# Altium footprint library led.PcbLib: 30 footprints (part 2 of 2)
Each footprint in its own frame and in the unit in brackets; x right, y up, seen from the top. Pads: shape width x height; smd on the part's side, far side on the other; paste and mask are expansions set on the pad; w line width, h text height; cw(c..) or ccw(c..) is an arc to the next point about the centre after c.
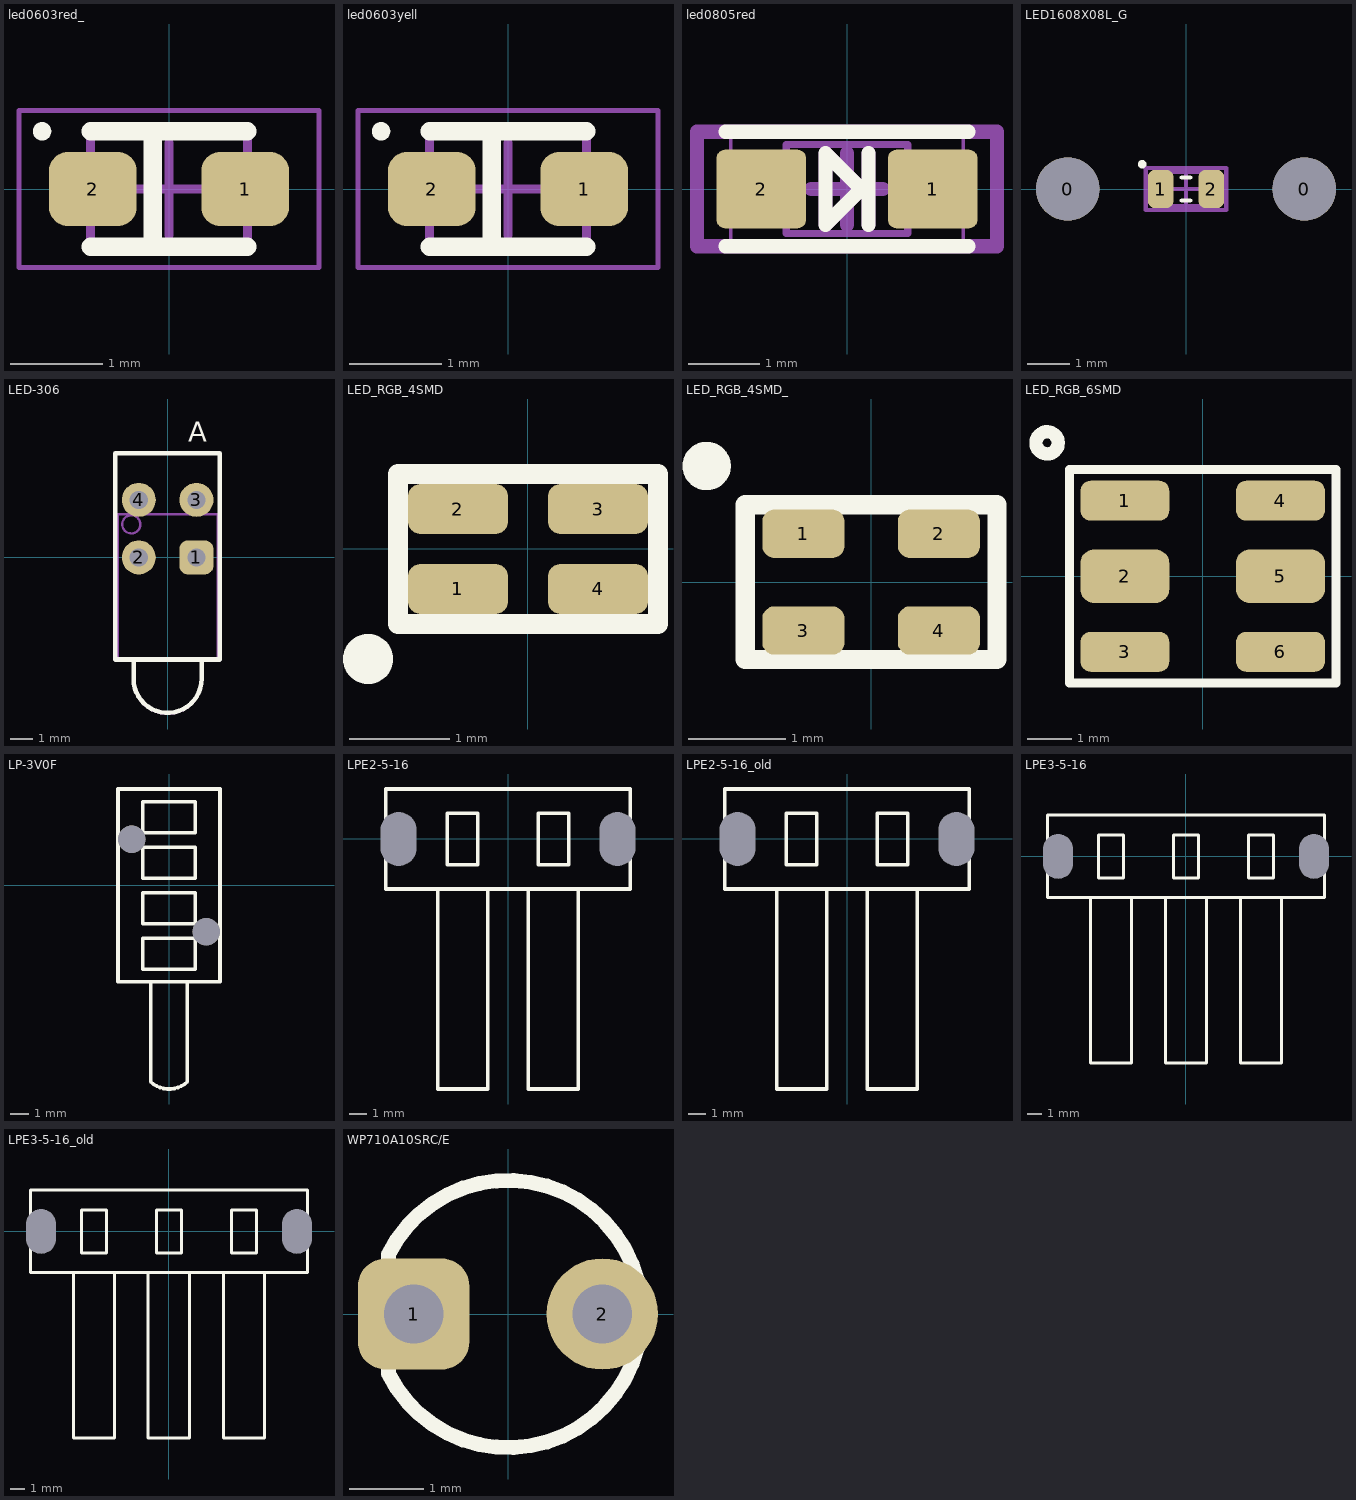
[diagram p1: the footprints below, top view; thin cyan lines are the x and y axes]

## led0603red_ [mm] "SOD323, IPC Low Density"
height 1.1
pads (2):
  rrect50% 0.95x0.8 smd: 1(0.825,0) 2(-0.825,0)
Top Overlay:
  circle w0.1: c-1.375,0.625 r0.05
  lines w0.2: -0.85,-0.625 0.85,-0.625 ; -0.85,0.625 0.85,0.625 ; -0.175,-0.625 -0.175,0.625
Mechanical 13:
  lines w0.1: -0.85,-0.625 -0.85,0.625 0.85,0.625 0.85,-0.625 -0.85,-0.625
Mechanical 15:
  lines w0.05: -1.625,-0.85 -1.625,0.85 1.625,0.85 1.625,-0.85 -1.625,-0.85
  lines w0.1: -0.5,0 0.5,0 ; 0,-0.5 0,0.5
3D body "led0603_RED.step": height 1.15, standoff 0.05, extent -0.81,-0.4 0.81,0.4

## led0603yell [mm] "SOD323, IPC Low Density"
height 1.1
pads (2):
  rrect50% 0.95x0.8 smd: 1(0.825,0) 2(-0.825,0)
Top Overlay:
  circle w0.1: c-1.375,0.625 r0.05
  lines w0.2: -0.85,-0.625 0.85,-0.625 ; -0.85,0.625 0.85,0.625 ; -0.175,-0.625 -0.175,0.625
Mechanical 13:
  lines w0.1: -0.85,-0.625 0.85,-0.625 0.85,0.625 -0.85,0.625 -0.85,-0.625
Mechanical 15:
  lines w0.05: -1.625,-0.85 1.625,-0.85 1.625,0.85 -1.625,0.85 -1.625,-0.85
  lines w0.1: -0.5,0 0.5,0 ; 0,-0.5 0,0.5
3D body "led_0603 yellow.step": height 0.65, standoff 0.05, extent -0.81,-0.4 0.81,0.4

## led0805red [mm] "IPC Low Density"
height 1.1
pads (2):
  rrect20% 1.25x1.1 smd: 1(1.2,0) 2(-1.2,0)
Top Overlay:
  lines w0.2: -1.7,-0.8 1.7,-0.8 ; -1.7,0.8 1.7,0.8 ; 0.3,-0.5 0.3,0.5 ; -0.3,-0.5 0.2,0 -0.3,0.5 -0.3,-0.5
M3_comm_top:
  text ".comment" at -0.9,-0.3 h1
M5_asm_top:
  lines w0.2: -1.7,-0.8 1.7,-0.8 ; -1.7,0.8 1.7,0.8 ; 0.3,-0.5 0.3,0.5 ; -0.3,-0.5 -0.3,0.5 0.2,0 -0.3,-0.5
  text ".Designator" at -1,1.3 h1
M7_courtyard_top:
  lines w0.2: -0.5,0 0.5,0 ; 0,-0.5 0,0.5 ; -2.1,-0.8 2.1,-0.8 2.1,0.8 -2.1,0.8 -2.1,-0.8
Mechanical 13:
  lines w0.1: -0.85,-0.625 0.85,-0.625 0.85,0.625 -0.85,0.625 -0.85,-0.625
Mechanical 15:
  lines w0.05: -1.625,-0.85 1.625,-0.85 1.625,0.85 -1.625,0.85 -1.625,-0.85
  lines w0.1: -0.5,0 0.5,0 ; 0,-0.5 0,0.5
3D body "User Library-led_0805.step": height 1.1, standoff 0, extent -1.01,-0.625 1.01,0.625

## LED1608X08L_G [mm] "Chip Diode, 2-Leads, Body 1,60x0,8mm, IPC High Density"
height 0.8
pads (4):
  round 1.5 hole 1.5: 0(-2.8,0) 0(2.8,0)
  rrect50% 0.6x0.9 smd: 1(-0.6,0) 2(0.6,0)
Top Overlay:
  circle w0.1: c-1.037,0.587 r0.05
  lines w0.1: -0.1,-0.275 0.1,-0.275 ; -0.1,0.275 0.1,0.275
M7_courtyard_top:
  lines w0.1: -0.4,0 0.4,0 ; 0,-0.4 0,0.4 ; -0.95,-0.5 0.95,-0.5 0.95,0.5 -0.95,0.5 -0.95,-0.5
M11_dimension:
  lines w0.1: -0.7,-0.4 0.7,-0.4 0.7,0.4 -0.7,0.4 -0.7,-0.4
3D body "light guide ra 0805.step": height 6.77, standoff -3.15, extent 3.845,-2.5 14.355,15.75
3D body "User Library-LED_0603_G.STEP": height 0.6, standoff 0, extent -0.8,-0.4 0.8,0.4
3D body "Svetovod.step": height 5, standoff -2.5, extent -3.8,-2.5 3.8,18

## LED-306 [mm] "LED-306(A) (CYX LED-2F)"
height 0.025
pads (4):
  rrect50% 1.5x1.5 hole 0.8: 1(1.27,0)
  round 1.5 hole 0.8: 2(-1.27,0) 3(1.27,2.54) 4(-1.27,2.54)
Top Overlay:
  lines w0.2: -1.5,-4.5 -1.5,-5.35 ccw(c0,-5.35) 1.5,-5.35 1.5,-4.5
  lines w0.203: -2.3,-4.5 2.3,-4.5 2.3,4.6 -2.3,4.6 -2.3,-4.5
  text "A" at 0.9,4.8 h1.52
Mechanical 13:
  circle w0.1: c-1.6,1.46 r0.4
  lines w0.1: -2.2,-4.5 -1.5,-4.5 -1.5,-5.4 ccw(c0,-5.4) 1.5,-5.4 1.5,-4.5 2.2,-4.5 2.2,1.9 -2.2,1.9 -2.2,-4.5
3D body "User Library-Lumex SSF-LXH240GGD.step": height 9.82, standoff -3.01, extent -2.16,-7.095 2.16,3.675

## LED_RGB_4SMD [mm] "WP154A4SUREQBFZGC"
height 5
pads (4):
  rrect50% 1x0.5 smd mask+0.1: 1(-0.7,-0.4) 2(-0.7,0.4) 3(0.7,0.4) 4(0.7,-0.4)
Top Overlay:
  circle w0.3: c-1.6,-1.1 r0.1
  lines w0.2: -1.3,-0.75 -1.3,0.75 1.3,0.75 1.3,-0.75 -1.3,-0.75
3D body: height 0.4, standoff 0.3, extent -0.3,0.1 -0.1,0.3
3D body: height 0.4, standoff 0.3, extent 0.1,0.1 0.3,0.3
3D body: height 0.4, standoff 0.3, extent -0.1,-0.3 0.1,-0.1
3D body "HSMF-C114.step": height 0.34, standoff -0.01, extent -0.8,-0.75 0.8,0.75

## LED_RGB_4SMD_ [mm] "SLM-LX0606IGC-TD"
height 5
pads (4):
  rrect50% 0.85x0.5 smd mask+0.1: 1(-0.7,0.5) 2(0.7,0.5) 3(-0.7,-0.5) 4(0.7,-0.5)
Top Overlay:
  circle w0.3: c-1.7,1.2 r0.1
  lines w0.2: -1.3,-0.8 1.3,-0.8 1.3,0.8 -1.3,0.8 -1.3,-0.8
3D body "HSMF-C114.step": height 0.34, standoff -0.01, extent -0.8,-0.75 0.8,0.75
3D body: height 0.4, standoff 0.3, extent -0.1,-0.3 0.1,-0.1
3D body: height 0.4, standoff 0.3, extent 0.1,0.1 0.3,0.3
3D body: height 0.4, standoff 0.3, extent -0.3,0.1 -0.1,0.3

## LED_RGB_6SMD [mm] "WP154A4SUREQBFZGC"
height 5
pads (6):
  rrect50% 2x0.9 smd mask+0.1: 1(-1.75,1.7) 3(-1.75,-1.7) 4(1.75,1.7) 6(1.75,-1.7)
  rrect50% 2x1.2 smd mask+0.1: 2(-1.75,0) 5(1.75,0)
Top Overlay:
  circle w0.3: c-3.5,3 r0.25
  lines w0.2: -3,-2.4 3,-2.4 3,2.4 -3,2.4 -3,-2.4
3D body: height 0.8, standoff 0.05, extent -1.25,-1.75 1.25,1.75
3D body: height 1.25, standoff 0.25, extent -0.991,-1.248 0,-0.252
3D body: height 1.25, standoff 0.25, extent -0.991,0.252 0,1.249
3D body: height 1.25, standoff 0.25, extent 0.009,-0.498 1,0.498
3D body: height 0.3, standoff 0.05, extent -1.75,-1.75 1.75,1.75

## LP-3V0F [mm]
height 0.025
pads (2):
  round 1.5 hole 1.5 unplated: ""(-2.05,2.54) ""(2.05,-2.54)
Top Overlay:
  lines w0.2: -1.009,-10.8 ccw(c0,-9.69) 1.009,-10.8 ; -1,-10.8 -1,-5.3 ; 1,-10.8 1,-5.3 ; -1.45,-4.6 -1.45,-2.9 1.45,-2.9 1.45,-4.6 -1.45,-4.6 ; -1.45,-2.1 -1.45,-0.4 1.45,-0.4 1.45,-2.1 -1.45,-2.1 ; -1.45,0.4 -1.45,2.1 1.45,2.1 1.45,0.4 -1.45,0.4 ; -1.45,2.9 1.45,2.9 1.45,4.6 -1.45,4.6 -1.45,2.9
  lines w0.203: -2.8,-5.3 -2.8,5.3 2.8,5.3 2.8,-5.3 -2.8,-5.3
3D body "LP-3V0F (1).stp": height 13.02, standoff -1.6, extent -2.8,-11.201 2.8,5.301

## LPE2-5-16 [mm] "LPE3-5-16 dart"
height 0.025
pads (2):
  round 1.5 hole 2 slot 3 at 90 deg unplated: ""(-6.125,0) ""(6.125,0)
Top Overlay:
  lines w0.2: -3.94,-2.8 -3.94,-14 -1.14,-14 -1.14,-2.8 ; 1.14,-2.8 1.14,-14 3.94,-14 3.94,-2.8 ; -6.85,-2.8 6.85,-2.8 6.85,2.8 -6.85,2.8 -6.85,-2.8 ; -3.4,-1.45 -3.4,1.45 -1.7,1.45 -1.7,-1.45 -3.4,-1.45 ; 1.7,-1.45 3.4,-1.45 3.4,1.45 1.7,1.45 1.7,-1.45
3D body "Световод 2 диода.STEP": height 6.43, standoff -2.85, extent -7.35,-14 7.35,2.9

## LPE2-5-16_old [mm] "LPE3-5-16 dart"
height 0.025
pads (2):
  round 1.5 hole 2 slot 3 at 90 deg unplated: ""(-6.125,0) ""(6.125,0)
Top Overlay:
  lines w0.2: -3.94,-2.8 -3.94,-14 -1.14,-14 -1.14,-2.8 ; 1.14,-2.8 1.14,-14 3.94,-14 3.94,-2.8 ; -6.85,-2.8 -6.85,2.8 6.85,2.8 6.85,-2.8 -6.85,-2.8 ; -3.4,-1.45 -1.7,-1.45 -1.7,1.45 -3.4,1.45 -3.4,-1.45 ; 1.7,-1.45 1.7,1.45 3.4,1.45 3.4,-1.45 1.7,-1.45
3D body "light guide ra 0805.step": height 6.77, standoff -3.15, extent -7.805,-15.35 2.705,2.9
3D body "light guide ra 0805.step": height 6.77, standoff -3.15, extent -2.68,-15.35 7.83,2.9

## LPE3-5-16 [mm] "LPE3-5-16 dart"
height 0.025
pads (2):
  round 1.5 hole 2 slot 3 at 90 deg unplated: ""(-8.675,0) ""(8.675,0)
Top Overlay:
  lines w0.2: -6.49,-2.8 -6.49,-14 -3.69,-14 -3.69,-2.8 ; 1.39,-2.8 1.39,-14 -1.39,-14 ; 3.69,-2.8 3.69,-14 6.49,-14 6.49,-2.8 ; -1.39,-14 -1.39,-2.8 -1.39,-14 ; -9.4,-2.8 9.4,-2.8 9.4,2.8 -9.4,2.8 -9.4,-2.8 ; -5.95,-1.45 -5.95,1.45 -4.25,1.45 -4.25,-1.45 -5.95,-1.45 ; -0.85,-1.45 0.85,-1.45 0.85,1.45 -0.85,1.45 -0.85,-1.45 ; 4.25,-1.45 4.25,1.45 5.95,1.45 5.95,-1.45 4.25,-1.45
3D body "Световод 3 диода.STEP": height 6.43, standoff -2.85, extent -9.917,-14 9.917,2.9

## LPE3-5-16_old [mm] "LPE3-5-16 dart"
height 0.025
pads (2):
  round 1.5 hole 2 slot 3 at 90 deg unplated: ""(-8.675,0) ""(8.675,0)
Top Overlay:
  lines w0.2: -6.49,-2.8 -6.49,-14 -3.69,-14 -3.69,-2.8 ; -1.41,-2.8 -1.41,-14 1.39,-14 1.39,-2.8 ; 3.69,-2.8 3.69,-14 6.49,-14 6.49,-2.8 ; -9.4,-2.8 -9.4,2.8 9.4,2.8 9.4,-2.8 -9.4,-2.8 ; -5.95,-1.45 -4.25,-1.45 -4.25,1.45 -5.95,1.45 -5.95,-1.45 ; -0.85,-1.45 -0.85,1.45 0.85,1.45 0.85,-1.45 -0.85,-1.45 ; 4.25,-1.45 5.95,-1.45 5.95,1.45 4.25,1.45 4.25,-1.45
3D body "light guide ra 0805.step": height 6.77, standoff -3.15, extent -5.23,-15.35 5.28,2.9
3D body "light guide ra 0805.step": height 6.77, standoff -3.15, extent -10.355,-15.35 0.155,2.9
3D body "light guide ra 0805.step": height 6.77, standoff -3.15, extent -0.13,-15.35 10.38,2.9
3D body "Световод 3 диода.STEP": height 6.4, standoff -2.87, extent -9.917,-14 9.917,2.9

## WP710A10SRC/E [mm] "WP710A10SRC/E"
height 0.025
pads (2):
  rrect50% 1.5x1.5 hole 0.8: 1(-1.27,0)
  round 1.5 hole 0.8: 2(1.27,0)
Top Overlay:
  lines w0.2: -1.61,-0.805 ccw(c0,0) -1.61,0.805 -1.61,-0.805
3D body "CircuitWorks-LED DIP 3MM.step": height 6.5, standoff -2, extent -1.6,-1.9 1.9,1.9